# Altium footprint library Excavator_part_PCB.PcbLib: 22 footprints (part 2 of 2)
Each footprint in its own frame and in the unit in brackets; x right, y up, seen from the top. Pads: shape width x height; smd on the part's side, far side on the other; paste and mask are expansions set on the pad; w line width, h text height; cw(c..) or ccw(c..) is an arc to the next point about the centre after c.
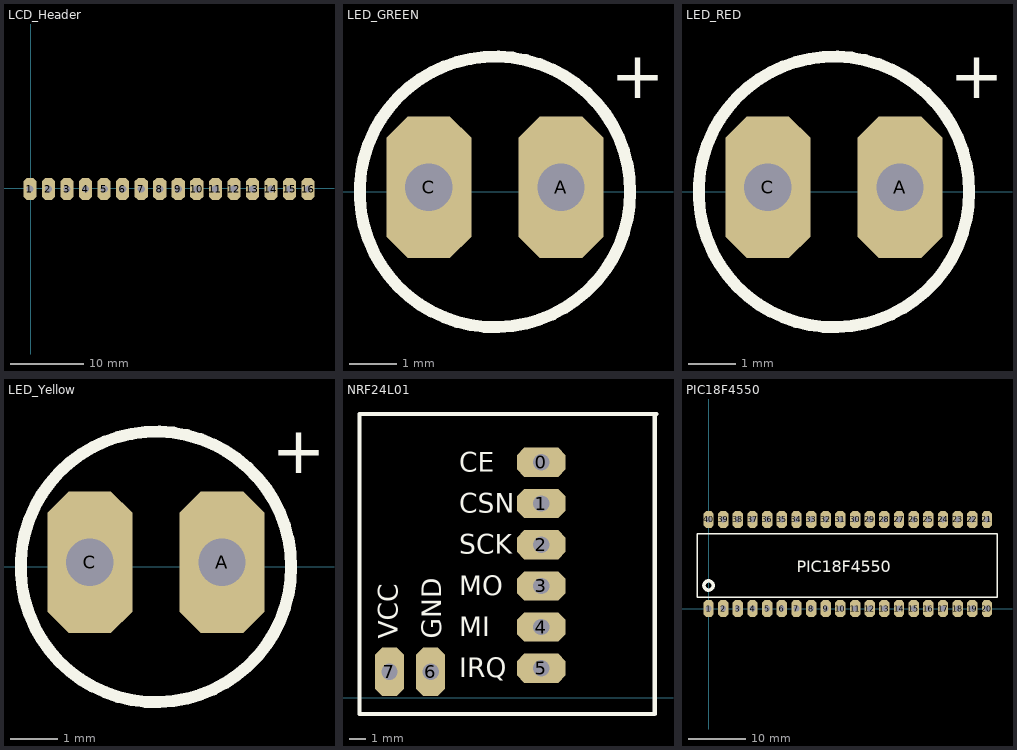
[diagram p1: the footprints below, top view; thin cyan lines are the x and y axes]

## LCD_Header [mm]
pads (16):
  oct 1.8x3 hole 1: 1(-0.1,-0.1) 2(2.44,-0.1) 3(4.98,-0.1) 4(7.52,-0.1) 5(10.06,-0.1) 6(12.6,-0.1) 7(15.14,-0.1) 8(17.68,-0.1) 9(20.22,-0.1) 10(22.76,-0.1) 11(25.3,-0.1) 12(27.84,-0.1) 13(30.38,-0.1) 14(32.92,-0.1) 15(35.46,-0.1) 16(38,-0.1)
3D body "Pin Header 1x16 TH Pitch 2.54mm.stp": height 9.5, standoff -3.2, extent -1.27,-1.27 39.37,1.27

## LED_GREEN [mm]
pads (2):
  oct 1.8x3 hole 1: A(7.5,0.1) C(4.7,0.1)
Top Overlay:
  circle w0.254: c6.1,0 r2.865
  text "+" at 8.554,1.987 h1
3D body "LEDGREEN 5mm.STEP": height 8.8, standoff -27, extent 3.6,-3 9.1,2.999

## LED_RED [mm]
pads (2):
  oct 1.8x3 hole 1: A(7.5,0.1) C(4.7,0.1)
Top Overlay:
  circle w0.254: c6.1,0 r2.865
  text "+" at 8.554,1.987 h1
3D body "LEDRED 5mm.STEP": height 8.8, standoff -27, extent 3.6,-3 9.1,3

## LED_Yellow [mm]
pads (2):
  oct 1.8x3 hole 1: A(7.5,0.1) C(4.7,0.1)
Top Overlay:
  circle w0.254: c6.1,0 r2.865
  text "+" at 8.554,1.987 h1
3D body "LEDYELLOW 5mm.STEP": height 8.8, standoff -27, extent 3.6,-3 9.1,3

## NRF24L01 [mm]
pads (8):
  oct 3x1.8 hole 1: 0(25.4,14.52) 1(25.4,11.98) 2(25.4,9.44) 3(25.4,6.9) 4(25.4,4.36) 5(25.4,1.82)
  oct 1.8x3 hole 1: 6(18.58,1.6) 7(16.04,1.6)
Top Overlay:
  lines w0.254: 14.2,-1 32.4,-1 32.4,17.4 32.5,17.5 14.2,17.5 14.2,-1
  text "CE" at 20.354,13.954 h1.2
  text "CSN" at 20.354,11.414 h1.2
  text "SCK" at 20.354,8.874 h1.2
  text "MO" at 20.354,6.334 h1.2
  text "MI" at 20.354,3.794 h1.2
  text "IRQ" at 20.354,1.254 h1.2
  text "VCC" at 16.546,3.654 h1.2
  text "GND" at 19.246,3.654 h1.2
3D body "NRF24L01_asm.STEP": height 46.5, standoff -0.19, extent 14.152,-1.1 32.5,17.5

## PIC18F4550 [mm] "PIC18F4550"
pads (40):
  oct 1.8x3 hole 1: 1(0,0) 2(2.54,0) 3(5.08,0) 4(7.62,0) 5(10.16,0) 6(12.7,0) 7(15.24,0) 8(17.78,0) 9(20.32,0) 10(22.86,0) 11(25.4,0) 12(27.94,0) 13(30.48,0) 14(33.02,0) 15(35.56,0) 16(38.1,0) 17(40.64,0) 18(43.18,0) 19(45.72,0) 20(48.26,0) 21(48.26,15.45) 22(45.72,15.45) 23(43.18,15.45) 24(40.64,15.45) 25(38.1,15.45) 26(35.56,15.45) 27(33.02,15.45) 28(30.48,15.45) 29(27.94,15.45) 30(25.4,15.45) 31(22.86,15.45) 32(20.32,15.45) 33(17.78,15.45) 34(15.24,15.45) 35(12.7,15.45) 36(10.16,15.45) 37(7.62,15.45) 38(5.08,15.45) 39(2.54,15.45) 40(0,15.45)
Top Overlay:
  circle w0.6: c0,4 r0.8
  lines w0.254: -2,2 50,2 50,13 -2,13 -2,2
  text "PIC18F4550" at 15.3,6.3 h2
3D body "User Library-PIC18F4550-DIP40-600.STEP": height 5.7, standoff -2.58, extent -2.175,-0.07 50.275,15.42